# Altium footprint library 封装库.PcbLib: 755 footprints (part 9 of 48)
Each footprint in its own frame and in the unit in brackets; x right, y up, seen from the top. Pads: shape width x height; smd on the part's side, far side on the other; paste and mask are expansions set on the pad; w line width, h text height; cw(c..) or ccw(c..) is an arc to the next point about the centre after c.
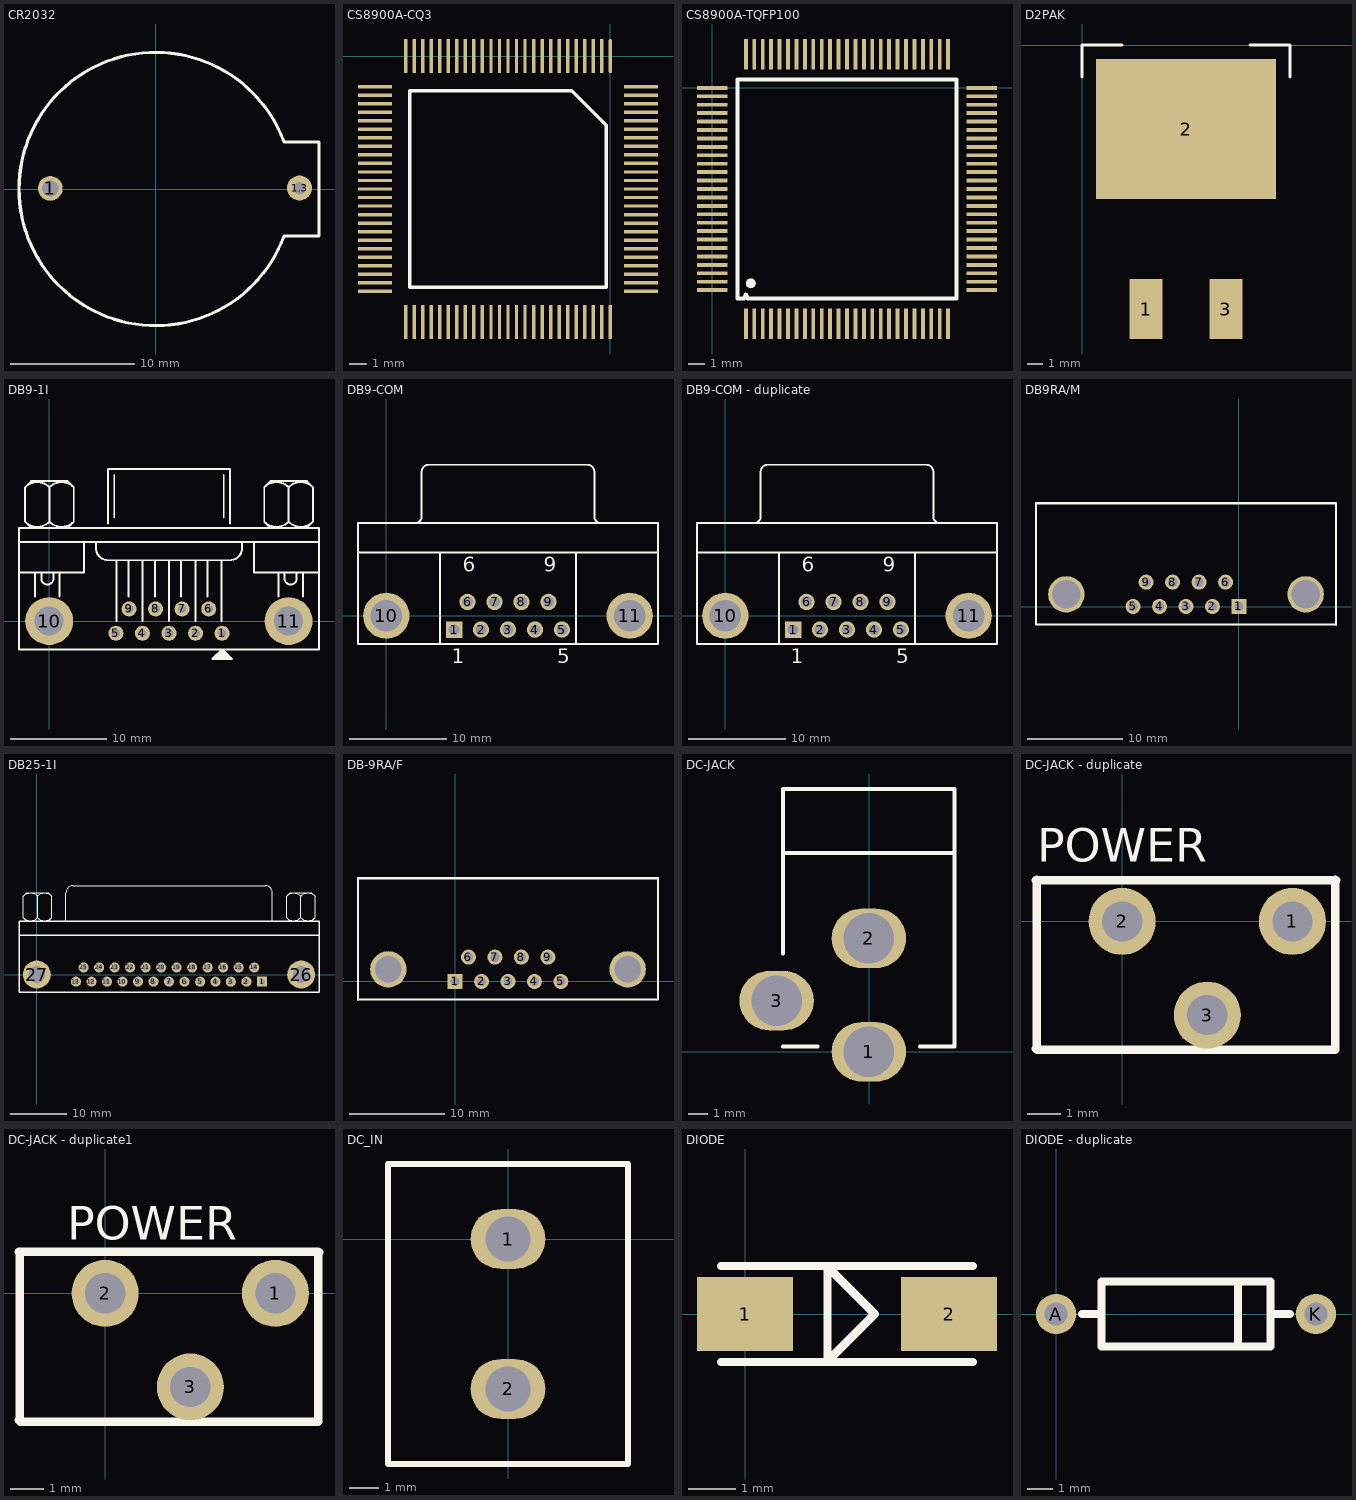
[diagram p8: the footprints below, top view; thin cyan lines are the x and y axes]

## CR2032 [mm]
pads (2):
  round 2 hole 1.3: 1(-8.509,0.051)
  round 2 hole 1: 1.3(11.557,0.076)
Top Overlay:
  lines w0.254: 10.3,-3.792 cw(c-0.025,0) 10.3,3.792 ; 10.317,-3.775 13.124,-3.775 13.124,3.775 10.354,3.775

## CS8900A-CQ3 [mm]
pads (100):
  oval 0.2x2 smd: 1(0,0.004)
  rect 0.2x2 smd: 2(-0.5,0.004) 3(-1,0.004) 4(-1.5,0.004) 5(-2,0.004) 6(-2.5,0.004) 7(-3,0.004) 8(-3.5,0.004) 9(-4,0.004) 10(-4.5,0.004) 11(-5,0.004) 12(-5.5,0.004) 13(-6,0.004) 14(-6.5,0.004) 15(-7,0.004) 16(-7.5,0.004) 17(-8,0.004) 18(-8.5,0.004) 19(-9,0.004) 20(-9.5,0.004) 21(-10,0.004) 22(-10.5,0.004) 23(-11,0.004) 24(-11.5,0.004) 25(-12,0.004) 51(-12,-15.596) 52(-11.5,-15.596) 53(-11,-15.596) 54(-10.5,-15.596) 55(-10,-15.596) 56(-9.5,-15.596) 57(-9,-15.596) 58(-8.5,-15.596) 59(-8,-15.596) 60(-7.5,-15.596) 61(-7,-15.596) 62(-6.5,-15.596) 63(-6,-15.596) 64(-5.5,-15.596) 65(-5,-15.596) 66(-4.5,-15.596) 67(-4,-15.596) 68(-3.5,-15.596) 69(-3,-15.596) 70(-2.5,-15.596) 71(-2,-15.596) 72(-1.5,-15.596) 73(-1,-15.596) 74(-0.5,-15.596) 75(0,-15.596)
  rect 2x0.2 smd: 26(-13.8,-1.796) 27(-13.8,-2.296) 28(-13.8,-2.796) 29(-13.8,-3.296) 30(-13.8,-3.796) 31(-13.8,-4.296) 32(-13.8,-4.796) 33(-13.8,-5.296) 34(-13.8,-5.796) 35(-13.8,-6.296) 36(-13.8,-6.796) 37(-13.8,-7.296) 38(-13.8,-7.796) 39(-13.8,-8.296) 40(-13.8,-8.796) 41(-13.8,-9.296) 42(-13.8,-9.796) 43(-13.8,-10.296) 44(-13.8,-10.796) 45(-13.8,-11.296) 46(-13.8,-11.796) 47(-13.8,-12.296) 48(-13.8,-12.796) 49(-13.8,-13.296) 50(-13.8,-13.796) 76(1.8,-13.796) 77(1.8,-13.296) 78(1.8,-12.796) 79(1.8,-12.296) 80(1.8,-11.796) 81(1.8,-11.296) 82(1.8,-10.796) 83(1.8,-10.296) 84(1.8,-9.796) 85(1.8,-9.296) 86(1.8,-8.796) 87(1.8,-8.296) 88(1.8,-7.796) 89(1.8,-7.296) 90(1.8,-6.796) 91(1.8,-6.296) 92(1.8,-5.796) 93(1.8,-5.296) 94(1.8,-4.796) 95(1.8,-4.296) 96(1.8,-3.796) 97(1.8,-3.296) 98(1.8,-2.796) 99(1.8,-2.296) 100(1.8,-1.796)
Top Overlay:
  lines w0.2: -11.765,-13.561 -0.235,-13.561 -0.235,-4.066 -2.27,-2.031 -11.765,-2.031 -11.765,-13.561

## CS8900A-TQFP100 [mm]
pads (100):
  rect 0.23x1.8 smd: 1(2,-14) 2(2.5,-14) 3(3,-14) 4(3.5,-14) 5(4,-14) 6(4.5,-14) 7(5,-14) 8(5.5,-14) 9(6,-14) 10(6.5,-14) 11(7,-14) 12(7.5,-14) 13(8,-14) 14(8.5,-14) 15(9,-14) 16(9.5,-14) 17(10,-14) 18(10.5,-14) 19(11,-14) 20(11.5,-14) 21(12,-14) 22(12.5,-14) 23(13,-14) 24(13.5,-14) 25(14,-14) 51(14,2) 52(13.5,2) 53(13,2) 54(12.5,2) 55(12,2) 56(11.5,2) 57(11,2) 58(10.5,2) 59(10,2) 60(9.5,2) 61(9,2) 62(8.5,2) 63(8,2) 64(7.5,2) 65(7,2) 66(6.5,2) 67(6,2) 68(5.5,2) 69(5,2) 70(4.5,2) 71(4,2) 72(3.5,2) 73(3,2) 74(2.5,2) 75(2,2)
  rect 1.8x0.23 smd: 26(16,-12) 27(16,-11.5) 28(16,-11) 29(16,-10.5) 30(16,-10) 31(16,-9.5) 32(16,-9) 33(16,-8.5) 34(16,-8) 35(16,-7.5) 36(16,-7) 37(16,-6.5) 38(16,-6) 39(16,-5.5) 40(16,-5) 41(16,-4.5) 42(16,-4) 43(16,-3.5) 44(16,-3) 45(16,-2.5) 46(16,-2) 47(16,-1.5) 48(16,-1) 49(16,-0.5) 50(16,0) 76(0,0) 77(0,-0.5) 78(0,-1) 79(0,-1.5) 80(0,-2) 81(0,-2.5) 82(0,-3) 83(0,-3.5) 84(0,-4) 85(0,-4.5) 86(0,-5) 87(0,-5.5) 88(0,-6) 89(0,-6.5) 90(0,-7) 91(0,-7.5) 92(0,-8) 93(0,-8.5) 94(0,-9) 95(0,-9.5) 96(0,-10) 97(0,-10.5) 98(0,-11) 99(0,-11.5) 100(0,-12)
Top Overlay:
  region: 2.588,-11.6 2.566,-11.49 2.504,-11.396 2.41,-11.334 2.3,-11.312 2.19,-11.334 2.096,-11.396 2.034,-11.49 2.012,-11.6 2.034,-11.71 2.096,-11.804 2.19,-11.866 2.3,-11.888 2.41,-11.866 2.504,-11.804 2.566,-11.71
  lines w0.254: 1.5,-12.5 1.885,-12.5 2,-12.27 2.115,-12.5 14.5,-12.5 14.5,0.5 1.5,0.5 1.5,-12.5

## D2PAK [mil]
pads (3):
  rect 82x150 smd: 1(160,-660) 3(360,-660)
  rect 450x350 smd: 2(260,-210)
Top Overlay:
  lines w8: 0,-80 0,0 100,0 ; 420,0 520,0 520,-80

## DB9-1I [mil]
pads (11):
  round 62 hole 35: 1(710.83,-50) 2(601.66,-50) 3(492.5,-50) 4(383.33,-50) 5(274.16,-50) 6(655.83,50) 7(546.66,50) 8(437.5,50) 9(328.33,50)
  round 197 hole 119: 10(0,0) 11(984.16,0)
Top Overlay:
  lines w8: -124.17,325.2 1109.16,325.2 ; -122.2,200 -107.5,200 142.5,200 142.5,323.45 ; -99.25,408.45 ccw(c-49.17,458.53) 0.91,408.45 0.92,550.28 ccw(c-49.16,500.19) -99.25,550.28 ; -74.17,383.53 -99.17,408.53 -99.17,550.2 -74.17,575.2 75.83,575.2 100.83,550.2 100.83,408.53 75.83,383.53 ; -57.5,100 -57.5,200 ; -32.5,200 -32.5,175 ccw(c-7.5,175) 17.5,175 17.5,200 ; 0.75,408.45 ccw(c50.83,458.53) 100.91,408.45 ; 0.75,550.28 cw(c50.84,500.19) 100.92,550.28 ; 42.5,100 42.5,200 ; 192.5,324.19 192.5,300 ccw(c242.5,300) 242.5,250 742.5,250 ccw(c742.5,300) 792.5,300 792.5,323.85 ; 242.5,400.2 242.5,625.2 742.5,625.2 742.5,400.2 ; 267.5,425.2 267.5,600.2 ; 275.83,0 275.83,250 ; 325.83,100 325.83,250 ; 384.16,0 384.16,250 ; 434.16,100 434.16,250 ; 492.5,0 492.5,250 ; 542.5,100 542.5,250 ; 600.83,0 600.83,250 ; 650.83,100 650.83,108.33 650.83,250 ; 678.38,-148.33 742.76,-148.33 ; 686.35,-140.35 734.78,-140.35 ; 694.03,-132.68 727.11,-132.68 ; 701.19,-125.51 720.14,-125.51 ; 709.16,0 709.16,250 ; 717.5,425.2 717.5,600.2 ; 842.5,323.79 842.5,200 1092.5,200 1107.19,200 ; 884.08,408.45 ccw(c934.16,458.54) 984.25,408.45 984.25,550.28 ccw(c934.16,500.19) 884.08,550.28 ; 909.16,383.53 884.16,408.53 884.16,550.2 909.16,575.2 1059.16,575.2 1084.16,550.2 1084.16,408.53 1059.16,383.53 ; 942.5,100 942.5,200 ; 967.5,200 967.5,175 ccw(c992.5,175) 1017.5,175 1017.5,200 ; 984.08,408.45 ccw(c1034.16,458.54) 1084.25,408.45 ; 984.08,550.28 cw(c1034.16,500.19) 1084.25,550.28 ; 1042.5,100 1042.5,200 ; -124.17,-116.67 -124.17,383.53 1109.16,383.53 1109.16,-116.67 -124.17,-116.67 ; 670.83,-155.87 710.83,-115.87 750.83,-155.87 670.83,-155.87
Multi-Layer:
  text "1" at 766.29,-69.68 h25
  text "5" at 187.55,-73.62 h25
  text "9" at 222.98,20.87 h25
  text "6" at 730.83,20 h25

## DB9-COM [mm]
pads (11):
  rect 1.69x1.69 hole 1.09: 1(6.955,-1.42)
  round 1.69 hole 1.09: 2(9.725,-1.42) 3(12.495,-1.42) 4(15.265,-1.42) 5(18.035,-1.42) 6(8.34,1.42) 7(11.11,1.42) 8(13.88,1.42) 9(16.65,1.42)
  round 4.76 hole 3.26: 10(0,0) 11(24.99,0)
Top Overlay:
  lines w0.2: -2.905,6.5 27.895,6.5 ; 2.935,9.505 ccw(c2.935,10.2) 3.63,10.2 3.63,14.8 ; 3.635,14.805 cw(c4.33,14.805) 4.33,15.5 20.66,15.5 cw(c20.66,14.805) 21.355,14.805 ; 5.495,-2.9 5.495,6.5 ; 19.495,-2.9 19.495,6.5 ; 21.36,14.8 21.36,10.2 ccw(c22.055,10.2) 22.055,9.505 ; -2.905,-2.9 27.895,-2.9 27.895,9.5 -2.905,9.5 -2.905,-2.9
  text "6" at 7.84,4.525 h1.5
  text "9" at 16.15,4.525 h1.5
  text "5" at 17.535,-4.875 h1.5
  text "1" at 6.705,-4.875 h1.5

## DB9-COM - duplicate [mm]
height 12.93
pads (11):
  rect 1.69x1.69 hole 1.09: 1(6.955,-1.42)
  round 1.69 hole 1.09: 2(9.725,-1.42) 3(12.495,-1.42) 4(15.265,-1.42) 5(18.035,-1.42) 6(8.34,1.42) 7(11.11,1.42) 8(13.88,1.42) 9(16.65,1.42)
  round 4.76 hole 3.26: 10(0,0) 11(24.99,0)
Top Overlay:
  lines w0.2: -2.905,6.5 27.895,6.5 ; 2.935,9.505 ccw(c2.935,10.2) 3.63,10.2 3.63,14.8 ; 3.635,14.805 cw(c4.33,14.805) 4.33,15.5 20.66,15.5 cw(c20.66,14.805) 21.355,14.805 ; 5.495,-2.9 5.495,6.5 ; 19.495,-2.9 19.495,6.5 ; 21.36,14.8 21.36,10.2 ccw(c22.055,10.2) 22.055,9.505 ; -2.905,-2.9 -2.905,9.5 27.895,9.5 27.895,-2.9 -2.905,-2.9
  text "1" at 6.705,-4.875 h1.5
  text "5" at 17.535,-4.875 h1.5
  text "9" at 16.15,4.525 h1.5
  text "6" at 7.84,4.525 h1.5

## DB9RA/M [mil]
pads (11):
  rect 62x62 hole 38: 1(0.09,0.24)
  round 62 hole 38: 2(-108.91,0.24) 3(-217.91,0.24) 4(-326.91,0.24) 5(-435.91,0.24) 6(-54.91,100.24) 7(-163.91,100.24) 8(-272.91,100.24) 9(-381.91,100.24)
  round 150 hole 118.11: ""(-710.91,50.24) ""(275.09,50.24)
Top Overlay:
  lines w8: -835.91,425.24 -835.91,-74.76 400.09,-74.76
  lines w10: -835.91,425.24 400.09,425.24 400.09,-74.76

## DB25-1I [mm]
pads (27):
  rect 1.8x1.8 hole 1: 1(40.208,-1.27)
  round 1.8 hole 1: 2(37.414,-1.27) 3(34.62,-1.27) 4(31.902,-1.27) 5(29.159,-1.27) 6(26.365,-1.27) 7(23.597,-1.27) 8(20.828,-1.27) 9(18.059,-1.27) 10(15.291,-1.27) 11(12.522,-1.27) 12(9.754,-1.27) 13(6.985,-1.27) 14(38.811,1.27) 15(36.043,1.27) 16(33.274,1.27) 17(30.505,1.27) 18(27.737,1.27) 19(24.968,1.27) 20(22.2,1.27) 21(19.431,1.27) 22(16.662,1.27) 23(13.894,1.27) 24(11.125,1.27) 25(8.357,1.27)
  round 5 hole 3: 26(47.193,0) 27(0,0)
Top Overlay:
  lines w0.203: -2.415,10.158 ccw(c-1.143,11.43) 0.129,10.158 0.129,13.972 ccw(c-1.143,12.7) -2.415,13.972 ; -1.778,9.525 -2.413,10.16 -2.413,13.97 -1.778,14.605 2.032,14.605 2.667,13.97 2.667,10.16 2.032,9.525 ; 0.125,10.158 ccw(c1.397,11.43) 2.669,10.158 ; 0.125,13.972 cw(c1.397,12.7) 2.669,13.972 ; 5.207,9.525 5.207,14.605 cw(c6.477,14.605) 6.477,15.875 40.767,15.875 cw(c40.767,14.605) 42.037,14.605 42.037,9.525 ; 44.575,10.158 ccw(c45.847,11.43) 47.119,10.158 47.119,13.972 ccw(c45.847,12.7) 44.575,13.972 ; 45.212,9.525 44.577,10.16 44.577,13.97 45.212,14.605 49.022,14.605 49.657,13.97 49.657,10.16 49.022,9.525 ; 47.115,10.158 ccw(c48.387,11.43) 49.659,10.158 ; 47.115,13.972 cw(c48.387,12.7) 49.659,13.972
  lines w0.254: -3.175,7.036 50.368,7.036 ; -3.175,-3.175 50.368,-3.175 50.368,9.525 -3.175,9.525 -3.175,-3.175
Multi-Layer:
  text "Comment" at 4.763,16.942 h0.64

## DB-9RA/F [mil]
pads (11):
  rect 62x62 hole 38: 1(0,0)
  round 62 hole 38: 2(109,0) 3(218,0) 4(327,0) 5(436,0) 6(55,100) 7(164,100) 8(273,100) 9(382,100)
  round 150 hole 110: ""(-275,50) ""(711,50)
Top Overlay:
  lines w8: -400,-75 836,-75 836,425
  lines w10: -400,-75 -400,425 836,425

## DC-JACK [mil]
pads (3):
  oval 150x120 hole 102: 1(-0.4,-0.19) 2(-0.4,228.81) 3(-186.4,102.81)
Top Overlay:
  lines w8: -173.4,10.81 -103.4,10.81 ; -173.4,197.81 -173.4,529.81 172.6,529.81 172.6,10.81 102.6,10.81 ; -173.4,400.81 172.6,400.81

## DC-JACK - duplicate [mm]
pads (3):
  round 2 hole 1.2: 1(5.08,0) 2(0,0) 3(2.54,-2.794)
Top Overlay:
  lines w0.254: -2.572,-3.793 -2.538,-3.827 6.35,-3.827 6.35,1.218 6.333,1.235 -2.572,1.235 ; -2.543,1.24 -2.543,-3.788 -2.509,-3.822 ; 6.362,1.24 6.379,1.223
  text "POWER" at -2.54,1.778 h1

## DC-JACK - duplicate1 [mm]
height 12.93
pads (3):
  round 2 hole 1.2: 1(5.08,0) 2(0,0) 3(2.54,-2.794)
Top Overlay:
  lines w0.254: -2.572,-3.793 -2.538,-3.827 6.35,-3.827 6.35,1.218 6.333,1.235 -2.572,1.235 ; -2.543,1.24 -2.543,-3.788 -2.509,-3.822 ; 6.362,1.24 6.379,1.223
  text "POWER" at -1.128,1.59 h1

## DC_IN [mil]
pads (2):
  oval 100x80 hole 60: 1(-0.3,0) 2(-0.3,-200)
Top Overlay:
  lines w8: -160.3,-300 -160.3,100 -80.3,100 79.7,100 159.7,100 159.7,-300 79.7,-300 -60.3,-300 -160.3,-300

## DIODE [mil]
pads (2):
  rect 80x62 smd: 1(0,0) 2(170,0)
Top Overlay:
  lines w7: -20,-40 190,-40 ; -20,40 190,40 ; 68.74,-39.37 68.74,39.37 108.11,0 68.74,-39.37

## DIODE - duplicate [mil]
pads (2):
  round 62 hole 35.43: A(0,0) K(400,0)
Top Overlay:
  lines w12: 40,0 70,0 ; 280,-50 280,50 ; 330,0 360,0 ; 70,-50 70,50 330,50 330,-50 70,-50